# Altium footprint library ATROTECH.PcbLib: 334 footprints (part 18 of 21)
Each footprint in its own frame and in the unit in brackets; x right, y up, seen from the top. Pads: shape width x height; smd on the part's side, far side on the other; paste and mask are expansions set on the pad; w line width, h text height; cw(c..) or ccw(c..) is an arc to the next point about the centre after c.
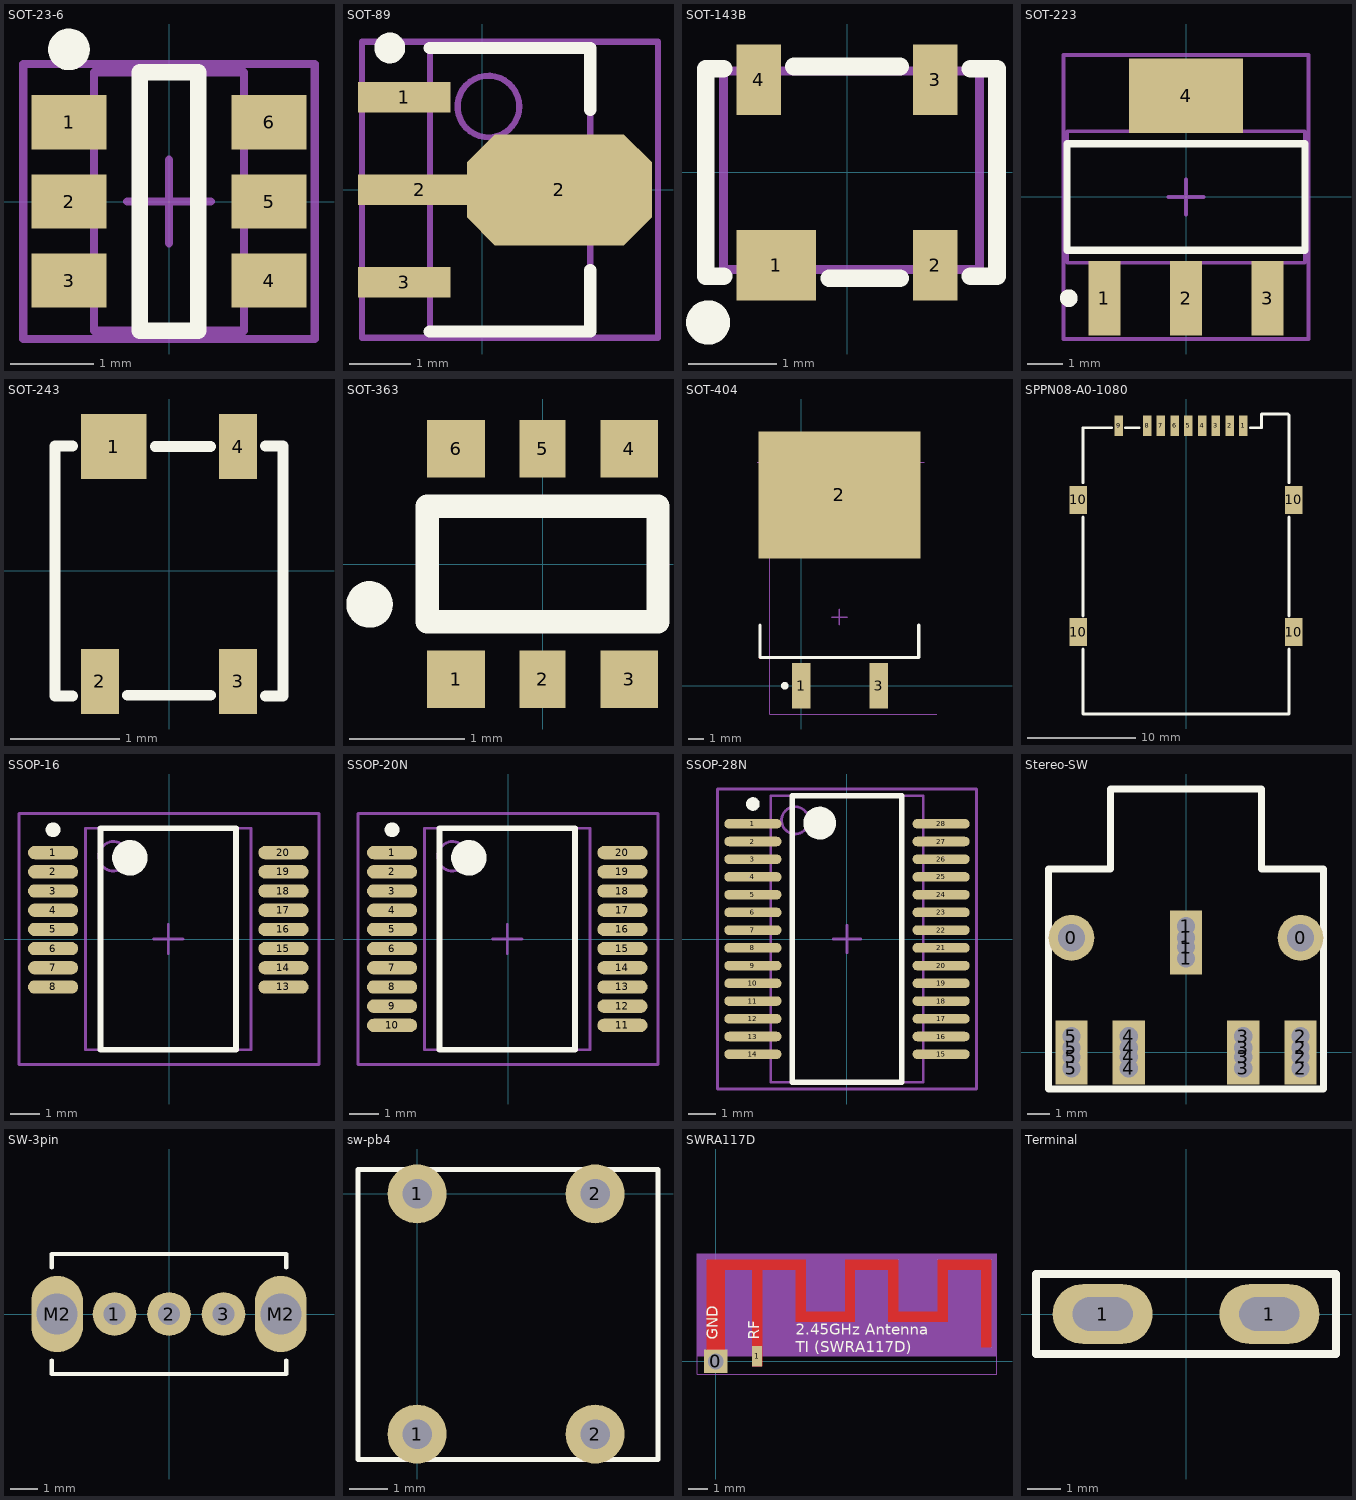
[diagram p17: the footprints below, top view; thin cyan lines are the x and y axes]

## SOT-23-6 [mm]
pads (6):
  rect 0.9x0.65 smd: 1(-1.2,0.95) 2(-1.2,0) 3(-1.2,-0.95) 4(1.2,-0.95) 5(1.2,0) 6(1.2,0.95)
Top Overlay:
  circle w0.25: c-1.2,1.825 r0.125
  lines w0.2: -0.35,-1.55 -0.35,1.55 0.35,1.55 0.35,-1.55 -0.35,-1.55
Mechanical 13:
  lines w0.1: -0.9,-1.55 0.9,-1.55 0.9,1.55 -0.9,1.55 -0.9,-1.55
Mechanical 15:
  lines w0.1: -0.5,0 0.5,0 ; 0,-0.5 0,0.5 ; -1.75,-1.65 1.75,-1.65 1.75,1.65 -1.75,1.65 -1.75,-1.65
3D body "User Library-SOT23-6-2.step": height 1.45, standoff 0, extent -1.4,-1.45 1.4,1.45

## SOT-89 [mm]
pads (4):
  rect 1.5x0.5 smd: 1(-1.266,1.5) 3(-1.266,-1.5)
  rect 2x0.5 smd: 2(-1.016,0)
  oct 3x1.8 smd: 2(1.25,0)
Top Overlay:
  circle w0.25: c-1.5,2.3 r0.125
  lines w0.2: -0.85,-2.3 1.75,-2.3 1.75,-1.3 ; -0.85,2.3 1.75,2.3 1.75,1.3
Mechanical 13:
  circle w0.1: c0.1,1.35 r0.5
  lines w0.1: -0.85,-2.3 -0.85,2.3 1.75,2.3 1.75,-2.3 -0.85,-2.3
Mechanical 15:
  lines w0.1: -0.05,0 0.95,0 ; 0.45,-0.5 0.45,0.5 ; -1.95,-2.4 -1.95,2.4 2.85,2.4 2.85,-2.4 -1.95,-2.4
3D body "CircuitWorks-SOT-89.step": height 1.5, standoff 0, extent -1.488,-2.25 2.512,2.25

## SOT-143B [mm]
pads (4):
  rect 0.9x0.8 smd: 1(-0.8,-1.05)
  rect 0.5x0.8 smd: 2(1,-1.05) 3(1,1.05) 4(-1,1.05)
Top Overlay:
  circle w0.25: c-1.575,-1.7 r0.125
  lines w0.2: -1.4,-1.175 -1.6,-1.175 -1.6,1.175 -1.4,1.175 ; -0.6,1.2 0.6,1.2 ; -0.2,-1.2 0.6,-1.2 ; 1.4,-1.175 1.7,-1.175 1.7,1.175 1.4,1.175
Mechanical 13:
  lines w0.1: -1.4,-1.1 -1.4,1.15 1.5,1.15 1.5,-1.1 -1.4,-1.1
3D body "User Library-sot143.step": height 1.65, standoff 0.65, extent -1.46,-1.21 1.46,1.21

## SOT-223 [mm]
pads (4):
  rect 0.9x2.1 smd: 1(-2.3,-2.85) 2(0,-2.85) 3(2.3,-2.85)
  rect 3.2x2.1 smd: 4(0,2.85)
Top Overlay:
  circle w0.25: c-3.3,-2.85 r0.125
  lines w0.2: -3.35,-1.5 3.35,-1.5 3.35,1.5 -3.35,1.5 -3.35,-1.5
Mechanical 13:
  lines w0.1: -3.35,-1.85 3.35,-1.85 3.35,1.85 -3.35,1.85 -3.35,-1.85
Mechanical 15:
  lines w0.1: -0.5,0 0.5,0 ; 0,-0.5 0,0.5 ; -3.45,-4 3.45,-4 3.45,4 -3.45,4 -3.45,-4
3D body "TO-223.STEP": height 1.64, standoff -0.04, extent -3.242,-3.49 3.243,3.49

## SOT-243 [mm]
pads (4):
  rect 0.6x0.6 smd: 1(-0.508,1.143)
  rect 0.35x0.6 smd: 2(-0.635,-1.016) 3(0.635,-1.016) 4(0.635,1.143)
Top Overlay:
  lines w0.1: -0.889,-1.15 -1.05,-1.15 -1.05,1.15 -0.889,1.15 ; -0.381,-1.143 0.381,-1.143 ; -0.127,1.143 0.381,1.143 ; 0.889,-1.15 1.05,-1.15 1.05,1.15 0.889,1.15
3D body "User Library-sot343.step": height 1, standoff 0, extent -1.05,-1.15 1.05,1.15

## SOT-363 [mm]
pads (6):
  rect 0.5x0.5 smd: 1(-0.75,-1) 3(0.75,-1) 4(0.75,1) 6(-0.75,1)
  rect 0.4x0.5 smd: 2(0,-1) 5(0,1)
Top Overlay:
  circle w0.203: c-1.5,-0.35 r0.1
  lines w0.203: -1,-0.5 -1,0.5 1,0.5 1,-0.5 -1,-0.5
3D body "User Library-sot363.step": height 1, standoff 0, extent -1.05,-1.15 1.05,1.15

## SOT-404 [mm]
pads (3):
  rect 1.2x3 smd: 1(0,0) 3(5.08,0)
  rect 10.6x8.3 smd: 2(2.5,12.5)
Top Overlay:
  circle w0.25: c-1.075,0 r0.125
  lines w0.2: -2.7,3.987 -2.7,1.85 7.7,1.85 7.7,3.987
Mechanical 13:
  lines w0.1: -2.7,1.85 7.7,1.85
Mechanical 15:
  lines w0.05: -2.875,14.65 8.075,14.65 ; -2.075,13.85 -2.075,-1.85 8.875,-1.85
  lines w0.1: 2,4.5 3,4.5 ; 2.5,4 2.5,5
3D body "User Library-sot404.step": height 4.55, standoff 0, extent -2.5,-0.3 7.5,15.5

## SPPN08-A0-1080 [mm] "8pin Sim card holder"
pads (13):
  rect 0.8x1.9 smd: 1(5.3,-3) 2(4.03,-3) 3(2.76,-3) 4(1.49,-3) 5(0.22,-3) 6(-1.05,-3) 7(-2.32,-3) 8(-3.59,-3) 9(-6.21,-3)
  rect 1.6x2.6 smd: 10(-9.95,-22.05) 10(-9.95,-9.85) 10(9.95,-22.05) 10(9.95,-9.85)
Top Overlay:
  lines w0.254: -9.525,-23.622 -9.525,-29.622 9.525,-29.622 9.525,-23.622 ; -9.525,-20.574 -9.525,-11.43 ; -9.525,-8.255 -9.525,-3.175 -6.858,-3.175 ; -5.588,-3.175 -4.318,-3.175 ; 5.969,-3.175 6.985,-3.175 6.985,-1.905 9.398,-1.905 9.525,-2.032 9.525,-8.255 ; 9.525,-20.574 9.525,-11.43

## SSOP-16 [mm]
pads (16):
  oval 1.7x0.45 smd: 1(-3.925,2.925) 2(-3.925,2.275) 3(-3.925,1.625) 4(-3.925,0.975) 5(-3.925,0.325) 6(-3.925,-0.325) 7(-3.925,-0.975) 8(-3.925,-1.625) 13(3.875,-1.625) 14(3.875,-0.975) 15(3.875,-0.325) 16(3.875,0.325) 17(3.875,0.975) 18(3.875,1.625) 19(3.875,2.275) 20(3.875,2.925)
Top Overlay:
  circle w0.6: c-1.325,2.75 r0.3
  circle w0.25: c-3.925,3.7 r0.125
  lines w0.2: -2.325,-3.75 2.275,-3.75 2.275,3.75 -2.325,3.75 -2.325,-3.75
Mechanical 13:
  circle w0.1: c-1.875,2.8 r0.5
  lines w0.1: -2.825,-3.75 2.775,-3.75 2.775,3.75 -2.825,3.75 -2.825,-3.75
Mechanical 15:
  lines w0.1: -0.525,0 0.475,0 ; -0.025,-0.5 -0.025,0.5 ; -5.08,-4.25 5.08,-4.25 5.08,4.25 -5.08,4.25 -5.08,-4.25
3D body "User Library-SSOP 20 PIN-1.step": height 1.88, standoff -0.11, extent -3.95,-3.665 3.95,3.665

## SSOP-20N [mm]
pads (20):
  oval 1.7x0.45 smd: 1(-3.925,2.925) 2(-3.925,2.275) 3(-3.925,1.625) 4(-3.925,0.975) 5(-3.925,0.325) 6(-3.925,-0.325) 7(-3.925,-0.975) 8(-3.925,-1.625) 9(-3.925,-2.275) 10(-3.925,-2.925) 11(3.875,-2.925) 12(3.875,-2.275) 13(3.875,-1.625) 14(3.875,-0.975) 15(3.875,-0.325) 16(3.875,0.325) 17(3.875,0.975) 18(3.875,1.625) 19(3.875,2.275) 20(3.875,2.925)
Top Overlay:
  circle w0.25: c-3.925,3.7 r0.125
  circle w0.6: c-1.325,2.75 r0.3
  lines w0.2: -2.325,-3.75 -2.325,3.75 2.275,3.75 2.275,-3.75 -2.325,-3.75
Mechanical 13:
  circle w0.1: c-1.875,2.8 r0.5
  lines w0.1: -2.825,-3.75 -2.825,3.75 2.775,3.75 2.775,-3.75 -2.825,-3.75
Mechanical 15:
  lines w0.1: -0.525,0 0.475,0 ; -0.025,-0.5 -0.025,0.5 ; -5.08,-4.25 -5.08,4.25 5.08,4.25 5.08,-4.25 -5.08,-4.25
3D body "User Library-SSOP 20 PIN-1.step": height 1.88, standoff -0.11, extent -3.95,-3.665 3.95,3.665

## SSOP-28N [mm]
height 2
pads (28):
  oval 2.1x0.35 smd: 1(-3.45,4.225) 2(-3.45,3.575) 3(-3.45,2.925) 4(-3.45,2.275) 5(-3.45,1.625) 6(-3.45,0.975) 7(-3.45,0.325) 8(-3.45,-0.325) 9(-3.45,-0.975) 10(-3.45,-1.625) 11(-3.45,-2.275) 12(-3.45,-2.925) 13(-3.45,-3.575) 14(-3.45,-4.225) 15(3.45,-4.225) 16(3.45,-3.575) 17(3.45,-2.925) 18(3.45,-2.275) 19(3.45,-1.625) 20(3.45,-0.975) 21(3.45,-0.325) 22(3.45,0.325) 23(3.45,0.975) 24(3.45,1.625) 25(3.45,2.275) 26(3.45,2.925) 27(3.45,3.575) 28(3.45,4.225)
Top Overlay:
  circle w0.25: c-3.45,4.95 r0.125
  circle w0.6: c-1,4.25 r0.3
  lines w0.2: -2,-5.25 -2,5.25 2,5.25 2,-5.25 -2,-5.25
Mechanical 13:
  circle w0.1: c-1.9,4.35 r0.5
  lines w0.1: -2.8,-5.25 -2.8,5.25 2.8,5.25 2.8,-5.25 -2.8,-5.25
Mechanical 15:
  lines w0.1: -0.5,0 0.5,0 ; 0,-0.5 0,0.5 ; -4.75,-5.5 -4.75,5.5 4.75,5.5 4.75,-5.5 -4.75,-5.5
3D body "PCB1.step": height 2.15, standoff 0, extent -3.734,-5.174 4.022,5.156

## Stereo-SW [mm]
pads (22):
  round 2 hole 1.2: 0(-5,5) 0(5,5)
  rect 1.4x1.4 hole 0.8: 1(0,4.1) 1(0,4.6) 1(0,5) 1(0,5.5) 2(5,-0.7) 2(5,-0.2) 2(5,0.2) 2(5,0.7) 3(2.5,-0.7) 3(2.5,-0.2) 3(2.5,0.2) 3(2.5,0.7) 4(-2.5,-0.7) 4(-2.5,-0.2) 4(-2.5,0.2) 4(-2.5,0.7) 5(-5,-0.7) 5(-5,-0.2) 5(-5,0.2) 5(-5,0.7)
Top Overlay:
  lines w0.3: -6,-1.6 -6,8 -3.3,8 -3.3,11.5 3.3,11.5 3.3,8 6,8 6,-1.6 -6,-1.6

## SW-3pin [mm]
pads (5):
  round 1.6 hole 0.8: 1(-2,0) 2(0,0) 3(2,0)
  oval 1.9x2.8 hole 1.5: M2(-4.1,0) M2(4.1,0)
Top Overlay:
  lines w0.15: -4.3,-1.7 -4.3,-2.2 4.3,-2.2 4.3,-1.7 ; -4.3,1.7 -4.3,2.2 4.3,2.2 4.3,1.7
3D body "switch.step": height 8.74, standoff -2.74, extent -4.305,-2.194 4.305,2.2

## sw-pb4 [mil]
pads (4):
  round 60 hole 30: 1(0,-244.09) 1(0,0) 2(181.1,-244.09) 2(181.1,0)
Top Overlay:
  lines w5: -60,-270 -60,25 245,25 245,-270 -60,-270
3D body "tactileswitch-short.STEP": height 195, standoff -133, extent -60.4,-253.5 242.4,-17

## SWRA117D [mil] "2.45GHz Antenna"
pads (2):
  rect 47.25x47.25 hole 31.5: 0(0,0)
  rect 20x40 smd: 1(82.67,10.24)
Top Layer:
  region: -17.72,-9.84 -17.72,202.76 179.13,202.76 179.13,98.82 257.87,98.82 257.87,202.76 364.17,202.76 364.17,98.82 442.91,98.82 442.91,202.76 549.21,202.76 549.21,27.96 529.52,27.96 529.52,183.07 462.6,183.07 462.6,79.14 344.48,79.14 344.48,183.07 277.56,183.07 277.56,79.14 159.45,79.14 159.45,183.07 92.52,183.07 92.52,-9.84 72.83,-9.84 72.83,183.07 17.71,183.07 17.71,-9.84
Top Overlay:
  text "TI (SWRA117D)" at 159.45,9.85 h37.2
  text "GND" at 11.81,43.31 h37.2
  text "RF" at 94.48,43.31 h37.2
  text "2.45GHz Antenna" at 159.45,45.28 h37.2
Mechanical 1:
  lines w0: -37.41,-25.59 -37.41,214.57 561.02,214.57 561.02,-25.59 -37.41,-25.59
Mechanical 27:
  rectangle: -37.41,9.85 561.02,214.57
Mechanical 28:
  rectangle: -37.41,9.85 561.02,214.57

## Terminal [mm]
height 10
pads (2):
  oval 3x1.8 hole 1 slot 1.8 at 0 deg: 1(-2.5,0) 1(2.5,0)
Top Overlay:
  lines w0.254: -4.5,-1.2 4.5,-1.2 4.5,1.2 -4.5,1.2 -4.5,-1.2